# Altium integrated library Altium_WE-RJ45_LAN (rev21a).IntLib: 96 symbols (continued)
## 7499151120
designator T?
WE-RJ45 LAN Transformer, THT, 10/100/1000 Base-T, Port 2x1, Tab Up/Down; Manufacturer Part Number: 7499151120; Manufacturer: Wurth Elektronik; PoE: non-PoE; LED: yellow-green; USB: No; Shield Tabs: Yes; ComponentLink1Description: Manufacturer; ComponentLink1URL: http://www.we-online.de; ComponentLink2Description: Datasheet; ComponentLink2URL: https://www.we-online.com/catalog/datasheet/7499151120.pdf; Published Date: October 2020; Tab: Up/Down; Port Number: 2x1; Data Rate: 10/100/1000 Base-T; Operating Temperature: -40 to +85degC; Mounting Technology: THT; Packaging: Tray; HPLE: No
footprint 7499151120
pins: A1 VCC, A2 D1+, A3 D1-, A4 D2+, A5 D3+, A6 D3-, A7 D2-, A8 D4+, A9 D4-, A10 NC, A11, A12, A13, A14, B1 VCC, B2 D1+, B3 D1-, B4 D2+, B5 D3+, B6 D3-, B7 D2-, B8 D4+, B9 D4-, B10 NC, B11, B12, B13, B14, Shell Shield

## 7499210001A
designator T?
WE-RJ45 LAN Transformer, THT, 10/100 Base-T, Port 1x1, Tab Up; Manufacturer Part Number: 7499210001A; Manufacturer: Wurth Elektronik; PoE: PoE (up to 350 mA); LED: No; ComponentLink1Description: Manufacturer; ComponentLink1URL: http://www.we-online.de; ComponentLink2Description: Datasheet; ComponentLink2URL: https://www.we-online.com/catalog/datasheet/7499210001A.pdf; Published Date: October 2020; Tab: Up; Port Number: 1x1; Data Rate: 10/100 Base-T; Operating Temperature: -40 to +85degC; USB: No; Mounting Technology: THT; Packaging: Tube; Shield Tabs: No; HPLE: No
footprint 7499210001A
pins: 1 TD+, 2 TCT, 3 TD-, 4 RD+, 5 RCT, 6 RD-, 9 VC1+, 10 VC1-, Shell Shield

## 7499210121A
designator T?
WE-RJ45 LAN Transformer, THT, 10/100 Base-T, Port 1x1, Tab Down; Manufacturer Part Number: 7499210121A; Manufacturer: Wurth Elektronik; PoE: PoE (up to 350 mA); LED: yellow-green; USB: No; ComponentLink1Description: Manufacturer; ComponentLink1URL: http://www.we-online.de; ComponentLink2Description: Datasheet; ComponentLink2URL: https://www.we-online.com/catalog/datasheet/7499210121A.pdf; Published Date: October 2020; Tab: Down; Port Number: 1x1; Data Rate: 10/100 Base-T; Operating Temperature: -40 to +85degC; Mounting Technology: THT; Packaging: Tube; Shield Tabs: No; HPLE: No
footprint 7499210121A
pins: 1 RD+, 2 RD-, 3 RCT, 4 TCT, 5 TD+, 6 TD-, 9 VC1+, 10 VC1-, 11, 12, 13, 14, Shell Shield

## 7499210123A
designator T?
WE-RJ45 LAN Transformer, THT, 10/100 Base-T, Port 1x1, Tab Vertical; Manufacturer Part Number: 7499210123A; Manufacturer: Wurth Elektronik; PoE: PoE (up to 350 mA); LED: yellow-green; USB: No; ComponentLink1Description: Manufacturer; ComponentLink1URL: http://www.we-online.de; ComponentLink2Description: Datasheet; ComponentLink2URL: https://www.we-online.com/catalog/datasheet/7499210123A.pdf; Published Date: October 2020; Tab: Vertical; Port Number: 1x1; Data Rate: 10/100 Base-T; Operating Temperature: -40 to +85degC; Mounting Technology: THT; Packaging: Tray; Shield Tabs: No; HPLE: No
footprint 7499210123A
pins: 1 RD+, 2 RD-, 3 RCT, 4 TCT, 5 TD+, 6 TD-, 9 VC1+, 10 VC1-, 11, 12, 13, 14, Shell Shield

## 7499210124A
designator T?
WE-RJ45 LAN Transformer, THT, 10/100 Base-T, Port 1x1, Tab Up; Manufacturer Part Number: 7499210124A; Manufacturer: Wurth Elektronik; PoE: PoE (up to 350 mA); LED: yellow-green; USB: No; ComponentLink1Description: Manufacturer; ComponentLink1URL: http://www.we-online.de; ComponentLink2Description: Datasheet; ComponentLink2URL: https://www.we-online.com/catalog/datasheet/7499210124A.pdf; Published Date: October 2020; Tab: Up; Port Number: 1x1; Data Rate: 10/100 Base-T; Operating Temperature: -40 to +85degC; Mounting Technology: THT; Packaging: Tube; Shield Tabs: No; HPLE: No
footprint 7499210124A
pins: 1 RD+, 2 RD-, 3 RCT, 4 TCT, 5 TD+, 6 TD-, 9 VC1+, 10 VC1-, 11, 12, 13, 14, Shell Shield

## 7499211002A
designator T?
WE-RJ45 LAN Transformer, THT, 10/100 Base-T, Port 1x1, Tab Down; Manufacturer Part Number: 7499211002A; Manufacturer: Wurth Elektronik; PoE: PoE (up to 350 mA); LED: No; Shield Tabs: Yes; ComponentLink1Description: Manufacturer; ComponentLink1URL: http://www.we-online.de; ComponentLink2Description: Datasheet; ComponentLink2URL: https://www.we-online.com/catalog/datasheet/7499211002A.pdf; Published Date: October 2020; Tab: Down; Port Number: 1x1; Data Rate: 10/100 Base-T; Operating Temperature: 0 to +70degC; USB: No; Mounting Technology: THT; Packaging: Tube; HPLE: No
footprint 7499211002A
pins: 1 TD+, 2 TD-, 3 TCT, 4 RD+, 5 RD-, 7 VC1+, 8 VC1-, 9 VC2+, 10 VC2-, Shell Shield

## 7499211121A
designator T?
WE-RJ45 LAN Transformer, THT, 10/100 Base-T, Port 1x1, Tab Down; Manufacturer Part Number: 7499211121A; Manufacturer: Wurth Elektronik; PoE: PoE (up to 350 mA); LED: yellow-green; USB: No; Shield Tabs: Yes; ComponentLink1Description: Manufacturer; ComponentLink1URL: http://www.we-online.de; ComponentLink2Description: Datasheet; ComponentLink2URL: https://www.we-online.com/catalog/datasheet/7499211121A.pdf; Published Date: October 2020; Tab: Down; Port Number: 1x1; Data Rate: 10/100 Base-T; Operating Temperature: -40 to +85degC; Mounting Technology: THT; Packaging: Tube; HPLE: No
footprint 7499211121A
pins: 1 RD+, 2 RD-, 3 RCT, 4 TCT, 5 TD+, 6 TD-, 9 VC1+, 10 VC1-, 11, 12, 13, 14, Shell Shield

## 7499211122A
designator T?
WE-RJ45 LAN Transformer, THT, 10/100 Base-T, Port 1x1, Tab Down; Manufacturer Part Number: 7499211122A; Manufacturer: Wurth Elektronik; PoE: PoE (up to 350 mA); LED: yellow-green; USB: No; Shield Tabs: Yes; ComponentLink1Description: Manufacturer; ComponentLink1URL: http://www.we-online.de; ComponentLink2Description: Datasheet; ComponentLink2URL: https://www.we-online.com/catalog/datasheet/7499211122A.pdf; Published Date: October 2020; Tab: Down; Port Number: 1x1; Data Rate: 10/100 Base-T; Operating Temperature: 0 to +70degC; Mounting Technology: THT; Packaging: Tube; HPLE: No
footprint 7499211122A
pins: 1 TD+, 2 TD-, 3 TCT, 4 RD+, 5 RD-, 7 VC1+, 8 VC1-, 9 VC2+, 10 VC2-, 11, 12, 13, 14, Shell Shield

## 7499211123A
designator T?
WE-RJ45 LAN Transformer, THT, 10/100 Base-T, Port 1x1, Tab Down; Manufacturer Part Number: 7499211123A; Manufacturer: Wurth Elektronik; PoE: PoE (up to 350 mA); LED: yellow-green; USB: No; Shield Tabs: Yes; ComponentLink1Description: Manufacturer; ComponentLink1URL: http://www.we-online.de; ComponentLink2Description: Datasheet; ComponentLink2URL: https://www.we-online.com/catalog/datasheet/7499211123A.pdf; Published Date: October 2020; Tab: Down; Port Number: 1x1; Data Rate: 10/100 Base-T; Operating Temperature: 0 to +70degC; Mounting Technology: THT; Packaging: Tube; HPLE: Yes
footprint 7499211123A
pins: 1 TD+, 2 TD-, 3 CTD, 4 RD+, 5 RD-, 7 VC1+, 8 VC1-, 9 VC2+, 10 VC2-, 11, 12, 13, 14, Shell Shield

## 7499211125
designator T?
WE-RJ45 LAN Transformer, THT, 10/100 Base-T, Port 1x1, Tab Up; Manufacturer Part Number: 7499211125; Manufacturer: Wurth Elektronik; PoE: PoE (up to 350 mA); LED: yellow-green; USB: No; Shield Tabs: Yes; ComponentLink1Description: Manufacturer; ComponentLink1URL: http://www.we-online.de; ComponentLink2Description: Datasheet; ComponentLink2URL: https://www.we-online.com/catalog/datasheet/7499211125.pdf; Published Date: October 2020; Tab: Up; Port Number: 1x1; Data Rate: 10/100 Base-T; Operating Temperature: -40 to +85degC; Mounting Technology: THT; Packaging: Tube; HPLE: No
footprint 7499211125
pins: 1 RD+, 2 RD-, 3 RCT, 4 TD+, 5 TCT, 6 TD-, 9 VC1+, 10 VC1-, 11, 12, 13, 14, Shell Shield

## 7499311614
designator T?
WE-RJ45 LAN Transformer, THT, 10/100/1000 Base-T, Port 1x1, Tab Up; Manufacturer Part Number: 7499311614; Manufacturer: Wurth Elektronik; PoE: 350mA; LED: green/orange-green; USB: No; Shield Tabs: Yes; ComponentLink1Description: Manufacturer; ComponentLink1URL: http://www.we-online.de; ComponentLink2Description: Datasheet; ComponentLink2URL: https://www.we-online.com/catalog/datasheet/7499311614.pdf; Published Date: October 2020; Tab: Up; Port Number: 1x1; Data Rate: 10/100/1000 Base-T; Operating Temperature: -40 to +85degC; Mounting Technology: THT; Packaging: Tray; HPLE: No
footprint 7499311614 (Footprint not found)
pins: 1 CD3, 2 D3-, 3 D3+, 4 D2+, 5 D2-, 6 CD2, 7 CD4, 8 D4+, 9 D4-, 10 D1-, 11 D1+, 12 CD1, 13 VC1, 14 VC2, 15 VC3, 16 VC4, 17, 18, 19, 20, Shell Shield

## 7499410213
designator T?
WE-RJ45 LAN Transformer, THT, 10/100 Base-T, Port 1x1, Tab Down; Manufacturer Part Number: 7499410213; Manufacturer: Wurth Elektronik; PoE: PoE+ (up to 600 mA); LED: yellow-green; USB: No; ComponentLink1Description: Manufacturer; ComponentLink1URL: http://www.we-online.de; ComponentLink2Description: Datasheet; ComponentLink2URL: https://www.we-online.com/catalog/datasheet/7499410213.pdf; Published Date: October 2020; Tab: Down; Port Number: 1x1; Data Rate: 10/100 Base-T; Operating Temperature: -40 to +85degC; Mounting Technology: THT; Packaging: Tube; Shield Tabs: No; HPLE: No
footprint 7499410213
pins: 1 TD+, 2 TD-, 3 TCT, 4 RD+, 5 RD-, 7 VC1+, 8 VC1-, 9 VC2+, 10 VC2-, 11, 12, 13, 14, Shell Shield

## 7499410221
designator T?
WE-RJ45 LAN Transformer, THT, 10/100 Base-T, Port 1x1, Tab Vertical; Manufacturer Part Number: 7499410221; Manufacturer: Wurth Elektronik; PoE: PoE+ (up to 600 mA); LED: green-green; USB: No; ComponentLink1Description: Manufacturer; ComponentLink1URL: http://www.we-online.de; ComponentLink2Description: Datasheet; ComponentLink2URL: https://www.we-online.com/catalog/datasheet/7499410221.pdf; Published Date: October 2020; Tab: Vertical; Port Number: 1x1; Data Rate: 10/100 Base-T; Operating Temperature: -40 to +85degC; Mounting Technology: THT; Packaging: Tube; Shield Tabs: No; HPLE: No
footprint 7499410221
pins: 1 TD+, 2 TCT, 3 TD-, 4 RD+, 5 RD-, 7 VC1-, 8 VC1+, 9 VC2-, 10 VC2+, 11, 12, 13, 14, Shell Shield

## 7499410440
designator T?
WE-RJ45 LAN Transformer, THT, 10/100 Base-T, Port 1, Tab Down; Manufacturer Part Number: 7499410440; Manufacturer: Wurth Elektronik; Port Number: 1; PoE: PoE+ (up to 720 mA); LED: yellow/green-yellow/green; USB: No; ComponentLink1Description: Manufacturer; ComponentLink1URL: http://www.we-online.de; ComponentLink2Description: Datasheet; ComponentLink2URL: https://www.we-online.com/catalog/datasheet/7499410440.pdf; Published Date: October 2020; Tab: Down; Data Rate: 10/100 Base-T; Operating Temperature: -40 to +85degC; Mounting Technology: THT; Packaging: Tray; Shield Tabs: No; HPLE: No
footprint 7499410440
pins: 1 TD+, 2 CTD, 3 TD-, 4 RD+, 5 CRD, 6 RD-, 11 V1, 12 V2, 13 V3, 14 V4, 15, 16, 17, 18, Shell Shield

## 7499411122A
designator T?
WE-RJ45 LAN Transformer, THT, 10/100 Base-T, Port 1x1, Tab Up; Manufacturer Part Number: 7499411122A; Manufacturer: Wurth Elektronik; PoE: PoE+ (up to 600 mA); LED: yellow-green; USB: No; Shield Tabs: Yes; ComponentLink1Description: Manufacturer; ComponentLink1URL: http://www.we-online.de; ComponentLink2Description: Datasheet; ComponentLink2URL: https://www.we-online.com/catalog/datasheet/7499411122A.pdf; Published Date: October 2020; Tab: Up; Port Number: 1x1; Data Rate: 10/100 Base-T; Operating Temperature: 0 to +70degC; Mounting Technology: THT; Packaging: Tray; HPLE: Yes
footprint 7499411122A
pins: 4 RD+, 5 RD-, 6 CRD, 10 TD-, 11 TD+, 12 TCT, 13 VC1+, 14 VC1-, 15 VC2+, 16 VC2-, 17, 18, 19, 20, Shell Shield

## 7499411440
designator T?
WE-RJ45 LAN Transformer, THT, 10/100 Base-T, Port 1, Tab Down; Manufacturer Part Number: 7499411440; Manufacturer: Wurth Elektronik; Port Number: 1; PoE: PoE+ (up to 720 mA); LED: yellow/green-yellow/green; USB: No; Shield Tabs: Yes; ComponentLink1Description: Manufacturer; ComponentLink1URL: http://www.we-online.de; ComponentLink2Description: Datasheet; ComponentLink2URL: https://www.we-online.com/catalog/datasheet/7499411440.pdf; Published Date: October 2020; Tab: Down; Data Rate: 10/100 Base-T; Operating Temperature: -40 to +85degC; Mounting Technology: THT; Packaging: Tray; HPLE: No
footprint 7499411440
pins: 1 TD+, 2 CTD, 3 TD-, 4 RD+, 5 CRD, 6 RD-, 11 V1, 12 V2, 13 V3, 14 V4, 15, 16, 17, 18, Shell Shield

## 7499510440
designator T?
WE-RJ45 LAN Transformer, THT, 1000 Base-T, Port 1, Tab Down; Manufacturer Part Number: 7499510440; Manufacturer: Wurth Elektronik; Port Number: 1; PoE: PoE (up to 600 mA); LED: yellow/green-yellow/green; USB: No; ComponentLink1Description: Manufacturer; ComponentLink1URL: http://www.we-online.de; ComponentLink2Description: Datasheet; ComponentLink2URL: https://www.we-online.com/catalog/datasheet/7499510440.pdf; Published Date: March 2021; Tab: Down; Data Rate: 1000 Base-T; Operating Temperature: -40 to +85degC; Mounting Technology: THT; Packaging: Tray; Shield Tabs: No; HPLE: No
footprint 7499510440
pins: 1 D1+, 2 D1-, 3 D2+, 4 VCC/GND, 5 VCC/GND, 6 D2-, 7 D3+, 8 D3-, 9 D4+, 10 D4-, 11 V1, 12 V2, 13 V3, 14 V4, 15, 16, 17, 18, Shell Shield

## 7499511002A
designator T?
WE-RJ45 LAN Transformer, THT, 10/100/1000 Base-T, Port 1x1, Tab Up; Manufacturer Part Number: 7499511002A; Manufacturer: Wurth Elektronik; PoE: PoE+ (up to 600 mA); LED: No; Shield Tabs: Yes; ComponentLink1Description: Manufacturer; ComponentLink1URL: http://www.we-online.de; ComponentLink2Description: Datasheet; ComponentLink2URL: https://www.we-online.com/catalog/datasheet/7499511002A.pdf; Published Date: October 2020; Tab: Up; Port Number: 1x1; Data Rate: 10/100/1000 Base-T; Operating Temperature: -40 to +85degC; USB: No; Mounting Technology: THT; Packaging: Tray; HPLE: Yes
footprint 7499511002A
pins: 1 CD3, 2 D3-, 3 D3+, 4 D2+, 5 D2-, 6 CD2, 7 CD4, 8 D4+, 9 D4-, 10 D1-, 11 D1+, 12 CD1, 13 VC1, 14 VC2, 15 VC3, 16 VC4, Shell Shield

## 7499511420
designator T?
WE-RJ45 LAN Transformer, THT, 10/100/1000 Base-T, Port 1x1, Tab Up; Manufacturer Part Number: 7499511420; Manufacturer: Wurth Elektronik; PoE: 1000mA; LED: green/orange-yellow; USB: No; Shield Tabs: Yes; ComponentLink1Description: Manufacturer; ComponentLink1URL: http://www.we-online.de; ComponentLink2Description: Datasheet; ComponentLink2URL: https://www.we-online.com/catalog/datasheet/7499511420.pdf; Published Date: October 2020; Tab: Up; Port Number: 1x1; Data Rate: 10/100/1000 Base-T; Operating Temperature: -40 to +85degC; Mounting Technology: THT; Packaging: Tray; HPLE: No
footprint 7499511420 (Footprint not found)
pins: 1 CD3, 2 D3+, 3 D3-, 4 D2-, 5 D2+, 6 CD2, 7 CD4, 8 D4-, 9 D4+, 10 D1+, 11 D1-, 12 CD1, 13 VC1, 14 VC2, 15 VC3, 16 VC4, 17, 18, 19, 20, Shell Shield

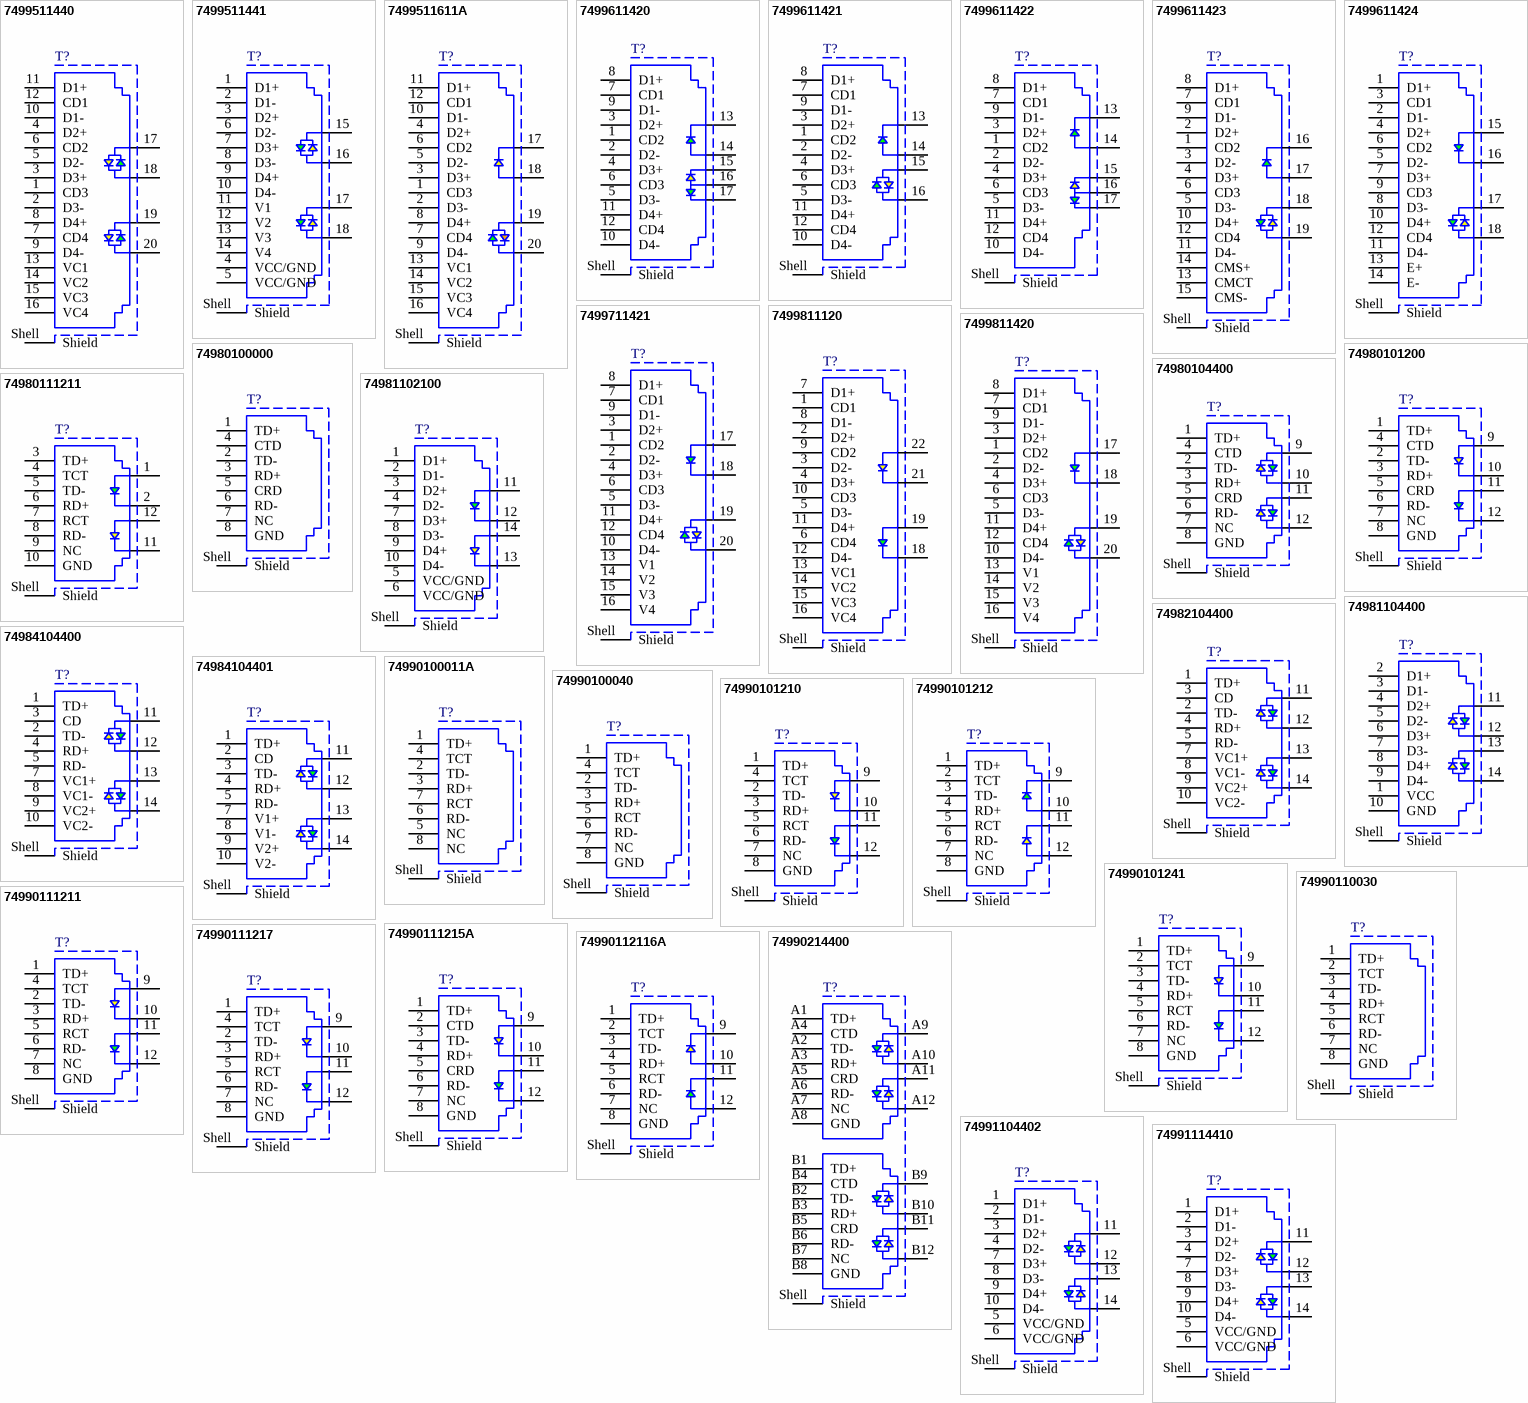
[diagram p2: symbols 7499511440 to 74991114410]

## 7499511440
designator T?
WE-RJ45 LAN Transformer, THT, 10/100/1000 Base-T, Port 1x1, Tab Up; Manufacturer Part Number: 7499511440; Manufacturer: Wurth Elektronik; PoE: PoE+ (up to 600 mA); LED: green/yellow-green/yellow; USB: No; Shield Tabs: Yes; ComponentLink1Description: Manufacturer; ComponentLink1URL: http://www.we-online.de; ComponentLink2Description: Datasheet; ComponentLink2URL: https://www.we-online.com/catalog/datasheet/7499511440.pdf; Published Date: October 2020; Tab: Up; Port Number: 1x1; Data Rate: 10/100/1000 Base-T; Operating Temperature: -40 to +85degC; Mounting Technology: THT; Packaging: Tray; HPLE: No
footprint 7499511440
pins: 1 CD3, 2 D3-, 3 D3+, 4 D2+, 5 D2-, 6 CD2, 7 CD4, 8 D4+, 9 D4-, 10 D1-, 11 D1+, 12 CD1, 13 VC1, 14 VC2, 15 VC3, 16 VC4, 17, 18, 19, 20, Shell Shield

## 7499511441
designator T?
WE-RJ45 LAN Transformer, THT, 1000 Base-T, Port 1x1, Tab Down; Manufacturer Part Number: 7499511441; Manufacturer: Wurth Elektronik; PoE: PoE (up to 600 mA); LED: green/yellow-green/yellow; USB: No; Shield Tabs: Yes; ComponentLink1Description: Manufacturer; ComponentLink1URL: http://www.we-online.de; ComponentLink2Description: Datasheet; ComponentLink2URL: https://www.we-online.com/catalog/datasheet/7499511441.pdf; Published Date: March 2021; Tab: Down; Port Number: 1x1; Data Rate: 1000 Base-T; Operating Temperature: -40 to +85degC; Mounting Technology: THT; Packaging: Tray; HPLE: No
footprint 7499511441
pins: 1 D1+, 2 D1-, 3 D2+, 4 VCC/GND, 5 VCC/GND, 6 D2-, 7 D3+, 8 D3-, 9 D4+, 10 D4-, 11 V1, 12 V2, 13 V3, 14 V4, 15, 16, 17, 18, Shell Shield

## 7499511611A
designator T?
WE-RJ45 LAN Transformer, THT, 10/100/1000 Base-T, Port 1x1, Tab Up; Manufacturer Part Number: 7499511611A; Manufacturer: Wurth Elektronik; PoE: PoE+ (up to 600 mA); LED: green/orange-yellow; USB: No; Shield Tabs: Yes; ComponentLink1Description: Manufacturer; ComponentLink1URL: http://www.we-online.de; ComponentLink2Description: Datasheet; ComponentLink2URL: https://www.we-online.com/catalog/datasheet/7499511611A.pdf; Published Date: October 2020; Tab: Up; Port Number: 1x1; Data Rate: 10/100/1000 Base-T; Operating Temperature: 0 to +70degC; Mounting Technology: THT; Packaging: Tray; HPLE: Yes
footprint 7499511611A
pins: 1 CD3, 2 D3-, 3 D3+, 4 D2+, 5 D2-, 6 CD2, 7 CD4, 8 D4+, 9 D4-, 10 D1-, 11 D1+, 12 CD1, 13 VC1, 14 VC2, 15 VC3, 16 VC4, 17, 18, 19, 20, Shell Shield

## 7499611420
designator T?
WE-RJ45 LAN Transformer, THT, 10G base-T, Port 1x1, Tab Up; Manufacturer Part Number: 7499611420; Manufacturer: Wurth Elektronik; PoE: non-PoE; LED: yellow/green-green; USB: No; Shield Tabs: Yes; ComponentLink1Description: Manufacturer; ComponentLink1URL: http://www.we-online.de; ComponentLink2Description: Datasheet; ComponentLink2URL: https://www.we-online.com/catalog/datasheet/7499611420.pdf; Published Date: October 2020; Tab: Up; Port Number: 1x1; Data Rate: 10G base-T; Operating Temperature: -40 to +85degC; Mounting Technology: THT; Packaging: Tube; HPLE: No
footprint 7499611420
pins: 1 CD2, 2 D2-, 3 D2+, 4 D3+, 5 D3-, 6 CD3, 7 CD1, 8 D1+, 9 D1-, 10 D4-, 11 D4+, 12 CD4, 13, 14, 15, 16, 17, Shell Shield

## 7499611421
designator T?
WE-RJ45 LAN Transformer, THT, 10G Base-T, Port 1x1, Tab Up; Manufacturer Part Number: 7499611421; Manufacturer: Wurth Elektronik; PoE: non-PoE; LED: yellow/green-green; USB: No; Shield Tabs: Yes; ComponentLink1Description: Manufacturer; ComponentLink1URL: http://www.we-online.de; ComponentLink2Description: Datasheet; ComponentLink2URL: https://www.we-online.com/catalog/datasheet/7499611421.pdf; Published Date: October 2020; Tab: Up; Port Number: 1x1; Data Rate: 10G Base-T; Operating Temperature: 0 to +70degC; Mounting Technology: THT; Packaging: Tube; HPLE: No
footprint 7499611421
pins: 1 CD2, 2 D2-, 3 D2+, 4 D3+, 5 D3-, 6 CD3, 7 CD1, 8 D1+, 9 D1-, 10 D4-, 11 D4+, 12 CD4, 13, 14, 15, 16, Shell Shield

## 7499611422
designator T?
WE-RJ45 LAN Transformer, THT, 10G Base-T, Port 1, Tab Down; Manufacturer Part Number: 7499611422; Manufacturer: Wurth Elektronik; Port Number: 1; PoE: non-PoE; LED: yellow-green; USB: No; Shield Tabs: Yes; ComponentLink1Description: Manufacturer; ComponentLink1URL: http://www.we-online.de; ComponentLink2Description: Datasheet; ComponentLink2URL: https://www.we-online.com/catalog/datasheet/7499611422.pdf; Published Date: October 2020; Tab: Down; Data Rate: 10G Base-T; Operating Temperature: -40 to +85degC; Mounting Technology: THT; Packaging: Tray; HPLE: No
footprint 7499611422
pins: 1 CD2, 2 D2-, 3 D2+, 4 D3+, 5 D3-, 6 CD3, 7 CD1, 8 D1+, 9 D1-, 10 D4-, 11 D4+, 12 CD4, 13, 14, 15, 16, 17, Shell Shield

## 7499611423
designator T?
WE-RJ45 LAN Transformer, THT, 10G Base-T, Port 1, Tab Down; Manufacturer Part Number: 7499611423; Manufacturer: Wurth Elektronik; Port Number: 1; PoE: non-PoE; LED: yellow-green; USB: No; Shield Tabs: Yes; ComponentLink1Description: Manufacturer; ComponentLink1URL: http://www.we-online.de; ComponentLink2Description: Datasheet; ComponentLink2URL: https://www.we-online.com/catalog/datasheet/7499611423.pdf; Published Date: October 2020; Tab: Down; Data Rate: 10G Base-T; Operating Temperature: -40 to +85degC; Mounting Technology: THT; Packaging: Tray; HPLE: No
footprint 7499611423
pins: 1 CD2, 2 D2+, 3 D2-, 4 D3+, 5 D3-, 6 CD3, 7 CD1, 8 D1+, 9 D1-, 10 D4+, 11 D4-, 12 CD4, 13 CMCT, 14 CMS+, 15 CMS-, 16, 17, 18, 19, Shell Shield

## 7499611424
designator T?
WE-RJ45 LAN Transformer, THT, 10G Base-T, Port 1, Tab Down; Manufacturer Part Number: 7499611424; Manufacturer: Wurth Elektronik; Port Number: 1; PoE: non-PoE; LED: yellow-green; USB: No; Shield Tabs: Yes; ComponentLink1Description: Manufacturer; ComponentLink1URL: http://www.we-online.de; ComponentLink2Description: Datasheet; ComponentLink2URL: https://www.we-online.com/catalog/datasheet/7499611424.pdf; Published Date: October 2020; Tab: Down; Data Rate: 10G Base-T; Operating Temperature: -40 to +85degC; Mounting Technology: THT; Packaging: Tray; HPLE: No
footprint 7499611424
pins: 1 D1+, 2 D1-, 3 CD1, 4 D2+, 5 D2-, 6 CD2, 7 D3+, 8 D3-, 9 CD3, 10 D4+, 11 D4-, 12 CD4, 13 E+, 14 E-, 15, 16, 17, 18, Shell Shield

## 7499711421
designator T?
WE-RJ45 LAN Transformer, THT, 10G Base-T, Port 1x1, Tab Up; Manufacturer Part Number: 7499711421; Manufacturer: Wurth Elektronik; PoE: PoE (up to 350 mA); LED: yellow/green-green; USB: No; Shield Tabs: Yes; ComponentLink1Description: Manufacturer; ComponentLink1URL: http://www.we-online.de; ComponentLink2Description: Datasheet; ComponentLink2URL: https://www.we-online.com/catalog/datasheet/7499711421.pdf; Published Date: October 2020; Tab: Up; Port Number: 1x1; Data Rate: 10G Base-T; Operating Temperature: -40 to +85degC; Mounting Technology: THT; Packaging: Tube; HPLE: No
footprint 7499711421
pins: 1 CD2, 2 D2-, 3 D2+, 4 D3+, 5 D3-, 6 CD3, 7 CD1, 8 D1+, 9 D1-, 10 D4-, 11 D4+, 12 CD4, 13 V1, 14 V2, 15 V3, 16 V4, 17, 18, 19, 20, Shell Shield

## 7499811120
designator T?
WE-RJ45 LAN Transformer, THT, 10G Base-T, Port 1, Tab Down; Manufacturer Part Number: 7499811120; Manufacturer: Wurth Elektronik; Port Number: 1; PoE: PoE+ (up to 1000 mA); LED: yellow-green; USB: No; Shield Tabs: Yes; ComponentLink1Description: Manufacturer; ComponentLink1URL: http://www.we-online.de; ComponentLink2Description: Datasheet; ComponentLink2URL: https://www.we-online.com/catalog/datasheet/7499811120.pdf; Published Date: October 2020; Tab: Down; Data Rate: 10G Base-T; Operating Temperature: -40 to +85degC; Mounting Technology: THT; Packaging: Tray; HPLE: No
footprint 7499811120
pins: 1 CD1, 2 D2+, 3 D2-, 4 D3+, 5 D3-, 6 CD4, 7 D1+, 8 D1-, 9 CD2, 10 CD3, 11 D4+, 12 D4-, 13 VC1, 14 VC2, 15 VC3, 16 VC4, 18, 19, 21, 22, Shell Shield

## 7499811420
designator T?
WE-RJ45 LAN Transformer, THT, 10G Base-T, Port 1x1, Tab Up; Manufacturer Part Number: 7499811420; Manufacturer: Wurth Elektronik; PoE: PoE+ (over 350 mA); LED: yellow/green-green; USB: No; Shield Tabs: Yes; ComponentLink1Description: Manufacturer; ComponentLink1URL: http://www.we-online.de; ComponentLink2Description: Datasheet; ComponentLink2URL: https://www.we-online.com/catalog/datasheet/7499811420.pdf; Published Date: October 2020; Tab: Up; Port Number: 1x1; Data Rate: 10G Base-T; Operating Temperature: -40 to +85degC; Mounting Technology: THT; Packaging: Tube; HPLE: No
footprint 7499811420
pins: 1 CD2, 2 D2-, 3 D2+, 4 D3+, 5 D3-, 6 CD3, 7 CD1, 8 D1+, 9 D1-, 10 D4-, 11 D4+, 12 CD4, 13 V1, 14 V2, 15 V3, 16 V4, 17, 18, 19, 20, Shell Shield

## 74980100000
designator T?
WE-RJ45 LAN Transformer, THR, 10/100 Base-T, Port 1x1, Tab Vertical; Manufacturer Part Number: 74980100000; Manufacturer: Wurth Elektronik; PoE: non-PoE; LED: No; ComponentLink1Description: Manufacturer; ComponentLink1URL: http://www.we-online.de; ComponentLink2Description: Datasheet; ComponentLink2URL: https://www.we-online.com/catalog/datasheet/74980100000.pdf; Published Date: October 2020; Tab: Vertical; Port Number: 1x1; Data Rate: 10/100 Base-T; Operating Temperature: -40 to +85degC; USB: No; Mounting Technology: THR; Packaging: Tape and Reel; Shield Tabs: No; HPLE: No
footprint 74980100000
pins: 1 TD+, 2 TD-, 3 RD+, 4 CTD, 5 CRD, 6 RD-, 7 NC, 8 GND, Shell Shield

## 74980101200
designator T?
WE-RJ45 LAN Transformer, THR, 10/100 Base-T, Port 1x1, Tab Vertical; Manufacturer Part Number: 74980101200; Manufacturer: Wurth Elektronik; PoE: non-PoE; LED: yellow-green; USB: No; ComponentLink1Description: Manufacturer; ComponentLink1URL: http://www.we-online.de; ComponentLink2Description: Datasheet; ComponentLink2URL: https://www.we-online.com/catalog/datasheet/74980101200.pdf; Published Date: October 2020; Tab: Vertical; Port Number: 1x1; Data Rate: 10/100 Base-T; Operating Temperature: -40 to +85degC; Mounting Technology: THR; Packaging: Tape and Reel; Shield Tabs: No; HPLE: No
footprint 74980101200
pins: 1 TD+, 2 TD-, 3 RD+, 4 CTD, 5 CRD, 6 RD-, 7 NC, 8 GND, 9, 10, 11, 12, Shell Shield

## 74980104400
designator T?
WE-RJ45 LAN Transformer, THR, 10/100 Base-T, Port 1x1, Tab Up; Manufacturer Part Number: 74980104400; Manufacturer: Wurth Elektronik; PoE: non-PoE; LED: green/yellow-green/yellow; USB: No; ComponentLink1Description: Manufacturer; ComponentLink1URL: http://www.we-online.de; ComponentLink2Description: Datasheet; ComponentLink2URL: https://www.we-online.com/catalog/datasheet/74980104400.pdf; Published Date: October 2020; Tab: Up; Port Number: 1x1; Data Rate: 10/100 Base-T; Operating Temperature: -40 to +85degC; Mounting Technology: THR; Packaging: Tape and Reel; Shield Tabs: No; HPLE: No
footprint 74980104400
pins: 1 TD+, 2 TD-, 3 RD+, 4 CTD, 5 CRD, 6 RD-, 7 NC, 8 GND, 9, 10, 11, 12, Shell Shield

## 74980111211
designator T?
WE-RJ45 LAN Transformer, SMT, 10/100 Base-T, Port 1x1, Tab Up; Manufacturer Part Number: 74980111211; Manufacturer: Wurth Elektronik; PoE: non-PoE; LED: yellow-green; USB: No; Shield Tabs: Yes; ComponentLink1Description: Manufacturer; ComponentLink1URL: http://www.we-online.de; ComponentLink2Description: Datasheet; ComponentLink2URL: https://www.we-online.com/catalog/datasheet/74980111211.pdf; Published Date: October 2020; Tab: Up; Port Number: 1x1; Data Rate: 10/100 Base-T; Operating Temperature: -40 to +85degC; Mounting Technology: SMT; Packaging: Tape and Reel; HPLE: No
footprint 74980111211
pins: 1, 2, 3 TD+, 4 TCT, 5 TD-, 6 RD+, 7 RCT, 8 RD-, 9 NC, 10 GND, 11, 12, Shell Shield

## 74981102100
designator T?
WE-RJ45 LAN Transformer, THR, 10/100/1000 Base-T, Port 1x1, Tab Vertical; Manufacturer Part Number: 74981102100; Manufacturer: Wurth Elektronik; PoE: non-PoE; LED: green-yellow; USB: No; ComponentLink1Description: Manufacturer; ComponentLink1URL: http://www.we-online.de; ComponentLink2Description: Datasheet; ComponentLink2URL: https://www.we-online.com/catalog/datasheet/74981102100.pdf; Published Date: October 2020; Tab: Vertical; Port Number: 1x1; Data Rate: 10/100/1000 Base-T; Operating Temperature: -40 to +85degC; Mounting Technology: THR; Packaging: Tape and Reel; Shield Tabs: No; HPLE: No
footprint 74981102100
pins: 1 D1+, 2 D1-, 3 D2+, 4 D2-, 5 VCC/GND, 6 VCC/GND, 7 D3+, 8 D3-, 9 D4+, 10 D4-, 11, 12, 13, 14, Shell Shield

## 74981104400
designator T?
WE-RJ45 LAN Transformer, THR, 10/100/1000 Base-T, Port 1x1, Tab Up; Manufacturer Part Number: 74981104400; Manufacturer: Wurth Elektronik; PoE: non-PoE; LED: green/yellow-green/yellow; USB: No; ComponentLink1Description: Manufacturer; ComponentLink1URL: http://www.we-online.de; ComponentLink2Description: Datasheet; ComponentLink2URL: https://www.we-online.com/catalog/datasheet/74981104400.pdf; Published Date: October 2020; Tab: Up; Port Number: 1x1; Data Rate: 10/100/1000 Base-T; Operating Temperature: -40 to +85degC; Mounting Technology: THR; Packaging: Tape and Reel; Shield Tabs: No; HPLE: No
footprint 74981104400
pins: 1 VCC, 2 D1+, 3 D1-, 4 D2+, 5 D2-, 6 D3+, 7 D3-, 8 D4+, 9 D4-, 10 GND, 11, 12, 13, 14, Shell Shield

## 74982104400
designator T?
WE-RJ45 LAN Transformer, THR, 10/100 Base-T, Port 1x1, Tab Up; Manufacturer Part Number: 74982104400; Manufacturer: Wurth Elektronik; PoE: PoE (up to 350 mA); LED: green/yellow-green/yellow; USB: No; ComponentLink1Description: Manufacturer; ComponentLink1URL: http://www.we-online.de; ComponentLink2Description: Datasheet; ComponentLink2URL: https://www.we-online.com/catalog/datasheet/74982104400.pdf; Published Date: October 2020; Tab: Up; Port Number: 1x1; Data Rate: 10/100 Base-T; Operating Temperature: -40 to +85degC; Mounting Technology: THR; Packaging: Tape and Reel; Shield Tabs: No; HPLE: No
footprint 74982104400
pins: 1 TD+, 2 TD-, 3 CD, 4 RD+, 5 RD-, 7 VC1+, 8 VC1-, 9 VC2+, 10 VC2-, 11, 12, 13, 14, Shell Shield

## 74984104400
designator T?
WE-RJ45 LAN Transformer, THR, 10/100 Base-T, Port 1x1, Tab Up; Manufacturer Part Number: 74984104400; Manufacturer: Wurth Elektronik; PoE: PoE+ (up to 600 mA); LED: green/yellow-green/yellow; USB: No; ComponentLink1Description: Manufacturer; ComponentLink1URL: http://www.we-online.de; ComponentLink2Description: Datasheet; ComponentLink2URL: https://www.we-online.com/catalog/datasheet/74984104400.pdf; Published Date: October 2020; Tab: Up; Port Number: 1x1; Data Rate: 10/100 Base-T; Operating Temperature: -40 to +85degC; Mounting Technology: THR; Packaging: Tape and Reel; Shield Tabs: No; HPLE: No
footprint 74984104400
pins: 1 TD+, 2 TD-, 3 CD, 4 RD+, 5 RD-, 7 VC1+, 8 VC1-, 9 VC2+, 10 VC2-, 11, 12, 13, 14, Shell Shield

## 74984104401
designator T?
WE-RJ45 LAN Transformer, THR, 10/100 Base-T, Port 1x1, Tab Up; Manufacturer Part Number: 74984104401; Manufacturer: Wurth Elektronik; PoE: PoE+ (up to 600 mA); LED: No; ComponentLink1Description: Manufacturer; ComponentLink1URL: http://www.we-online.de; ComponentLink2Description: Datasheet; ComponentLink2URL: https://www.we-online.com/catalog/datasheet/74984104401.pdf; Published Date: October 2020; Tab: Up; Port Number: 1x1; Data Rate: 10/100 Base-T; Operating Temperature: -40 to +85degC; USB: No; Mounting Technology: THR; Packaging: Tape and Reel; Shield Tabs: No; HPLE: No
footprint 74984104401
pins: 1 TD+, 2 CD, 3 TD-, 4 RD+, 5 RD-, 7 V1+, 8 V1-, 9 V2+ (power), 10 V2- (power), 11, 12, 13, 14, Shell Shield

## 74990100011A
designator T?
WE-RJ45 LAN Transformer, THT, 10/100 Base-T, Port 1x1, Tab Up; Manufacturer Part Number: 74990100011A; Manufacturer: Wurth Elektronik; PoE: non-PoE; LED: No; ComponentLink1Description: Manufacturer; ComponentLink1URL: http://www.we-online.de; ComponentLink2Description: Datasheet; ComponentLink2URL: https://www.we-online.com/catalog/datasheet/74990100011A.pdf; Published Date: October 2020; Tab: Up; Port Number: 1x1; Data Rate: 10/100 Base-T; Operating Temperature: -40 to +85degC; USB: No; Mounting Technology: THT; Packaging: Tube; Shield Tabs: No; HPLE: No
footprint 74990100011A
pins: 1 TD+, 2 TD-, 3 RD+, 4 TCT, 5 NC, 6 RD-, 7 RCT, 8 NC, Shell Shield

## 74990100040
designator T?
WE-RJ45 LAN Transformer, THT, 10/100 Base-T, Port 1x1, Tab Down; Manufacturer Part Number: 74990100040; Manufacturer: Wurth Elektronik; PoE: non-PoE; LED: no; ComponentLink1Description: Manufacturer; ComponentLink1URL: http://www.we-online.de; ComponentLink2Description: Datasheet; ComponentLink2URL: https://www.we-online.com/catalog/datasheet/74990100040.pdf; Published Date: October 2020; Tab: Down; Port Number: 1x1; Data Rate: 10/100 Base-T; Operating Temperature: -40 to +85degC; USB: No; Mounting Technology: THT; Packaging: Tube; Shield Tabs: no; HPLE: No
footprint 74990100040 (Footprint not found)
pins: 1 TD+, 2 TD-, 3 RD+, 4 TCT, 5 RCT, 6 RD-, 7 NC, 8 GND, Shell Shield

## 74990101210
designator T?
WE-RJ45 LAN Transformer, THT, 10/100 Base-T, Port 1x1, Tab Vertical; Manufacturer Part Number: 74990101210; Manufacturer: Wurth Elektronik; PoE: non-PoE; LED: yellow-green; USB: No; ComponentLink1Description: Manufacturer; ComponentLink1URL: http://www.we-online.de; ComponentLink2Description: Datasheet; ComponentLink2URL: https://www.we-online.com/catalog/datasheet/74990101210.pdf; Published Date: October 2020; Tab: Vertical; Port Number: 1x1; Data Rate: 10/100 Base-T; Operating Temperature: -40 to +85degC; Mounting Technology: THT; Packaging: Tube; Shield Tabs: No; HPLE: No
footprint 74990101210
pins: 1 TD+, 2 TD-, 3 RD+, 4 TCT, 5 RCT, 6 RD-, 7 NC, 8 GND, 9, 10, 11, 12, Shell Shield

## 74990101212
designator T?
WE-RJ45 LAN Transformer, THT, 10/100 Base-T, Port 1x1, Tab Up; Manufacturer Part Number: 74990101212; Manufacturer: Wurth Elektronik; PoE: non-PoE; LED: yellow-green; USB: No; ComponentLink1Description: Manufacturer; ComponentLink1URL: http://www.we-online.de; ComponentLink2Description: Datasheet; ComponentLink2URL: https://www.we-online.com/catalog/datasheet/74990101212.pdf; Published Date: October 2020; Tab: Up; Port Number: 1x1; Data Rate: 10/100 Base-T; Operating Temperature: -40 to +85degC; Mounting Technology: THT; Packaging: Tube; Shield Tabs: No; HPLE: No
footprint 74990101212
pins: 1 TD+, 2 TCT, 3 TD-, 4 RD+, 5 RCT, 6 RD-, 7 NC, 8 GND, 9, 10, 11, 12, Shell Shield

## 74990101241
designator T?
WE-RJ45 LAN Transformer, THT, 10/100 Base-T, Port 1x1, Tab Vertical; Manufacturer Part Number: 74990101241; Manufacturer: Wurth Elektronik; PoE: non-PoE; LED: yellow-green; USB: No; ComponentLink1Description: Manufacturer; ComponentLink1URL: http://www.we-online.de; ComponentLink2Description: Datasheet; ComponentLink2URL: https://www.we-online.com/catalog/datasheet/74990101241.pdf; Published Date: October 2020; Tab: Vertical; Port Number: 1x1; Data Rate: 10/100 Base-T; Operating Temperature: -40 to +85degC; Mounting Technology: THT; Packaging: Tube; Shield Tabs: No; HPLE: No
footprint 74990101241
pins: 1 TD+, 2 TCT, 3 TD-, 4 RD+, 5 RCT, 6 RD-, 7 NC, 8 GND, 9, 10, 11, 12, Shell Shield

## 74990110030
designator T?
WE-RJ45 LAN Transformer, THT, 10/100 Base-T, Port 1x1, Tab Up; Manufacturer Part Number: 74990110030; Manufacturer: Wurth Elektronik; PoE: non-PoE; LED: No; Shield Tabs: Yes; ComponentLink1Description: Manufacturer; ComponentLink1URL: http://www.we-online.de; ComponentLink2Description: Datasheet; ComponentLink2URL: https://www.we-online.com/catalog/datasheet/74990110030.pdf; Published Date: October 2020; Tab: Up; Port Number: 1x1; Data Rate: 10/100 Base-T; Operating Temperature: 0 to +70degC; USB: No; Mounting Technology: THT; Packaging: Tube; HPLE: No
footprint 74990110030
pins: 1 TD+, 2 TCT, 3 TD-, 4 RD+, 5 RCT, 6 RD-, 7 NC, 8 GND, Shell Shield

## 74990111211
designator T?
WE-RJ45 LAN Transformer, THT, 10/100 Base-T, Port 1x1, Tab Down; Manufacturer Part Number: 74990111211; Manufacturer: Wurth Elektronik; PoE: non-PoE; LED: yellow-green; USB: No; Shield Tabs: Yes; ComponentLink1Description: Manufacturer; ComponentLink1URL: http://www.we-online.de; ComponentLink2Description: Datasheet; ComponentLink2URL: https://www.we-online.com/catalog/datasheet/74990111211.pdf; Published Date: October 2020; Tab: Down; Port Number: 1x1; Data Rate: 10/100 Base-T; Operating Temperature: -40 to +85degC; Mounting Technology: THT; Packaging: Tube; HPLE: No
footprint 74990111211
pins: 1 TD+, 2 TD-, 3 RD+, 4 TCT, 5 RCT, 6 RD-, 7 NC, 8 GND, 9, 10, 11, 12, Shell Shield

## 74990111215A
designator T?
WE-RJ45 LAN Transformer, THT, 10/100 Base-T, Port 1x1, Tab Down; Manufacturer Part Number: 74990111215A; Manufacturer: Wurth Elektronik; PoE: non-PoE; LED: yellow-green; USB: No; Shield Tabs: Yes; ComponentLink1Description: Manufacturer; ComponentLink1URL: http://www.we-online.de; ComponentLink2Description: Datasheet; ComponentLink2URL: https://www.we-online.com/catalog/datasheet/74990111215A.pdf; Published Date: October 2020; Tab: Down; Port Number: 1x1; Data Rate: 10/100 Base-T; Operating Temperature: 0 to +70degC; Mounting Technology: THT; Packaging: Tube; HPLE: Yes
footprint 74990111215A
pins: 1 TD+, 2 CTD, 3 TD-, 4 RD+, 5 CRD, 6 RD-, 7 NC, 8 GND, 9, 10, 11, 12, Shell Shield

## 74990111217
designator T?
WE-RJ45 LAN Transformer, THT, 10/100 Base-T, Port 1x1, Tab Up; Manufacturer Part Number: 74990111217; Manufacturer: Wurth Elektronik; PoE: non-PoE; LED: yellow-green; USB: No; Shield Tabs: Yes; ComponentLink1Description: Manufacturer; ComponentLink1URL: http://www.we-online.de; ComponentLink2Description: Datasheet; ComponentLink2URL: https://www.we-online.com/catalog/datasheet/74990111217.pdf; Published Date: October 2020; Tab: Up; Port Number: 1x1; Data Rate: 10/100 Base-T; Operating Temperature: -40 to +85degC; Mounting Technology: THT; Packaging: Tube; HPLE: No
footprint 74990111217
pins: 1 TD+, 2 TD-, 3 RD+, 4 TCT, 5 RCT, 6 RD-, 7 NC, 8 GND, 9, 10, 11, 12, Shell Shield

## 74990112116A
designator T?
WE-RJ45 LAN Transformer, THT, 10/100 Base-T, Port 1x1, Tab Up; Manufacturer Part Number: 74990112116A; Manufacturer: Wurth Elektronik; PoE: non-PoE; LED: green-yellow; USB: No; Shield Tabs: Yes; ComponentLink1Description: Manufacturer; ComponentLink1URL: http://www.we-online.de; ComponentLink2Description: Datasheet; ComponentLink2URL: https://www.we-online.com/catalog/datasheet/74990112116A.pdf; Published Date: October 2020; Tab: Up; Port Number: 1x1; Data Rate: 10/100 Base-T; Operating Temperature: -40 to +85degC; Mounting Technology: THT; Packaging: Tube; HPLE: No
footprint 74990112116A
pins: 1 TD+, 2 TCT, 3 TD-, 4 RD+, 5 RCT, 6 RD-, 7 NC, 8 GND, 9, 10, 11, 12, Shell Shield

## 74990214400
designator T?
WE-RJ45 LAN Transformer, THT, 10/100 Base-T, Port 1x2, Tab Up; Manufacturer Part Number: 74990214400; Manufacturer: Wurth Elektronik; PoE: non-PoE; LED: yellow/green-yellow/green; USB: No; Shield Tabs: Yes; ComponentLink1Description: Manufacturer; ComponentLink1URL: http://www.we-online.de; ComponentLink2Description: Datasheet; ComponentLink2URL: https://www.we-online.com/catalog/datasheet/74990214400.pdf; Published Date: October 2020; Tab: Up; Port Number: 1x2; Data Rate: 10/100 Base-T; Operating Temperature: -40 to +85degC; Mounting Technology: THT; Packaging: Tray; HPLE: No
footprint 74990214400
pins: A1 TD+, A2 TD-, A3 RD+, A4 CTD, A5 CRD, A6 RD-, A7 NC, A8 GND, A9, A10, A11, A12, B1 TD+, B2 TD-, B3 RD+, B4 CTD, B5 CRD, B6 RD-, B7 NC, B8 GND, B9, B10, B11, B12, Shell Shield

## 74991104402
designator T?
WE-RJ45 LAN Transformer, THT, 1000 Base-T, Port 1, Tab Vertical; Manufacturer Part Number: 74991104402; Manufacturer: Wurth Elektronik; Port Number: 1; PoE: non-PoE; LED: yellow/green-yellow/green; USB: No; ComponentLink1Description: Manufacturer; ComponentLink1URL: http://www.we-online.de; ComponentLink2Description: Datasheet; ComponentLink2URL: https://www.we-online.com/catalog/datasheet/74991104402.pdf; Published Date: October 2020; Tab: Vertical; Data Rate: 1000 Base-T; Operating Temperature: -40 to +85degC; Mounting Technology: THT; Packaging: Tray; Shield Tabs: No; HPLE: No
footprint 74991104402
pins: 1 D1+, 2 D1-, 3 D2+, 4 D2-, 5 VCC/GND, 6 VCC/GND, 7 D3+, 8 D3-, 9 D4+, 10 D4-, 11, 12, 13, 14, Shell Shield

## 74991114410
designator T?
WE-RJ45 LAN Transformer, THT, 1000 Base-T, Port 1, Tab Vertical; Manufacturer Part Number: 74991114410; Manufacturer: Wurth Elektronik; Port Number: 1; PoE: non-PoE; LED: yellow/green-yellow/green; USB: No; Shield Tabs: Yes; ComponentLink1Description: Manufacturer; ComponentLink1URL: http://www.we-online.de; ComponentLink2Description: Datasheet; ComponentLink2URL: https://www.we-online.com/catalog/datasheet/74991114410.pdf; Published Date: October 2020; Tab: Vertical; Data Rate: 1000 Base-T; Operating Temperature: -40 to +85degC; Mounting Technology: THT; Packaging: Tray; HPLE: No
footprint 74991114410
pins: 1 D1+, 2 D1-, 3 D2+, 4 D2-, 5 VCC/GND, 6 VCC/GND, 7 D3+, 8 D3-, 9 D4+, 10 D4-, 11, 12, 13, 14, Shell Shield